# Altium footprint library Package_SO.PcbLib: 333 footprints (part 15 of 21)
Each footprint in its own frame and in the unit in brackets; x right, y up, seen from the top. Pads: shape width x height; smd on the part's side, far side on the other; paste and mask are expansions set on the pad; w line width, h text height; cw(c..) or ccw(c..) is an arc to the next point about the centre after c.
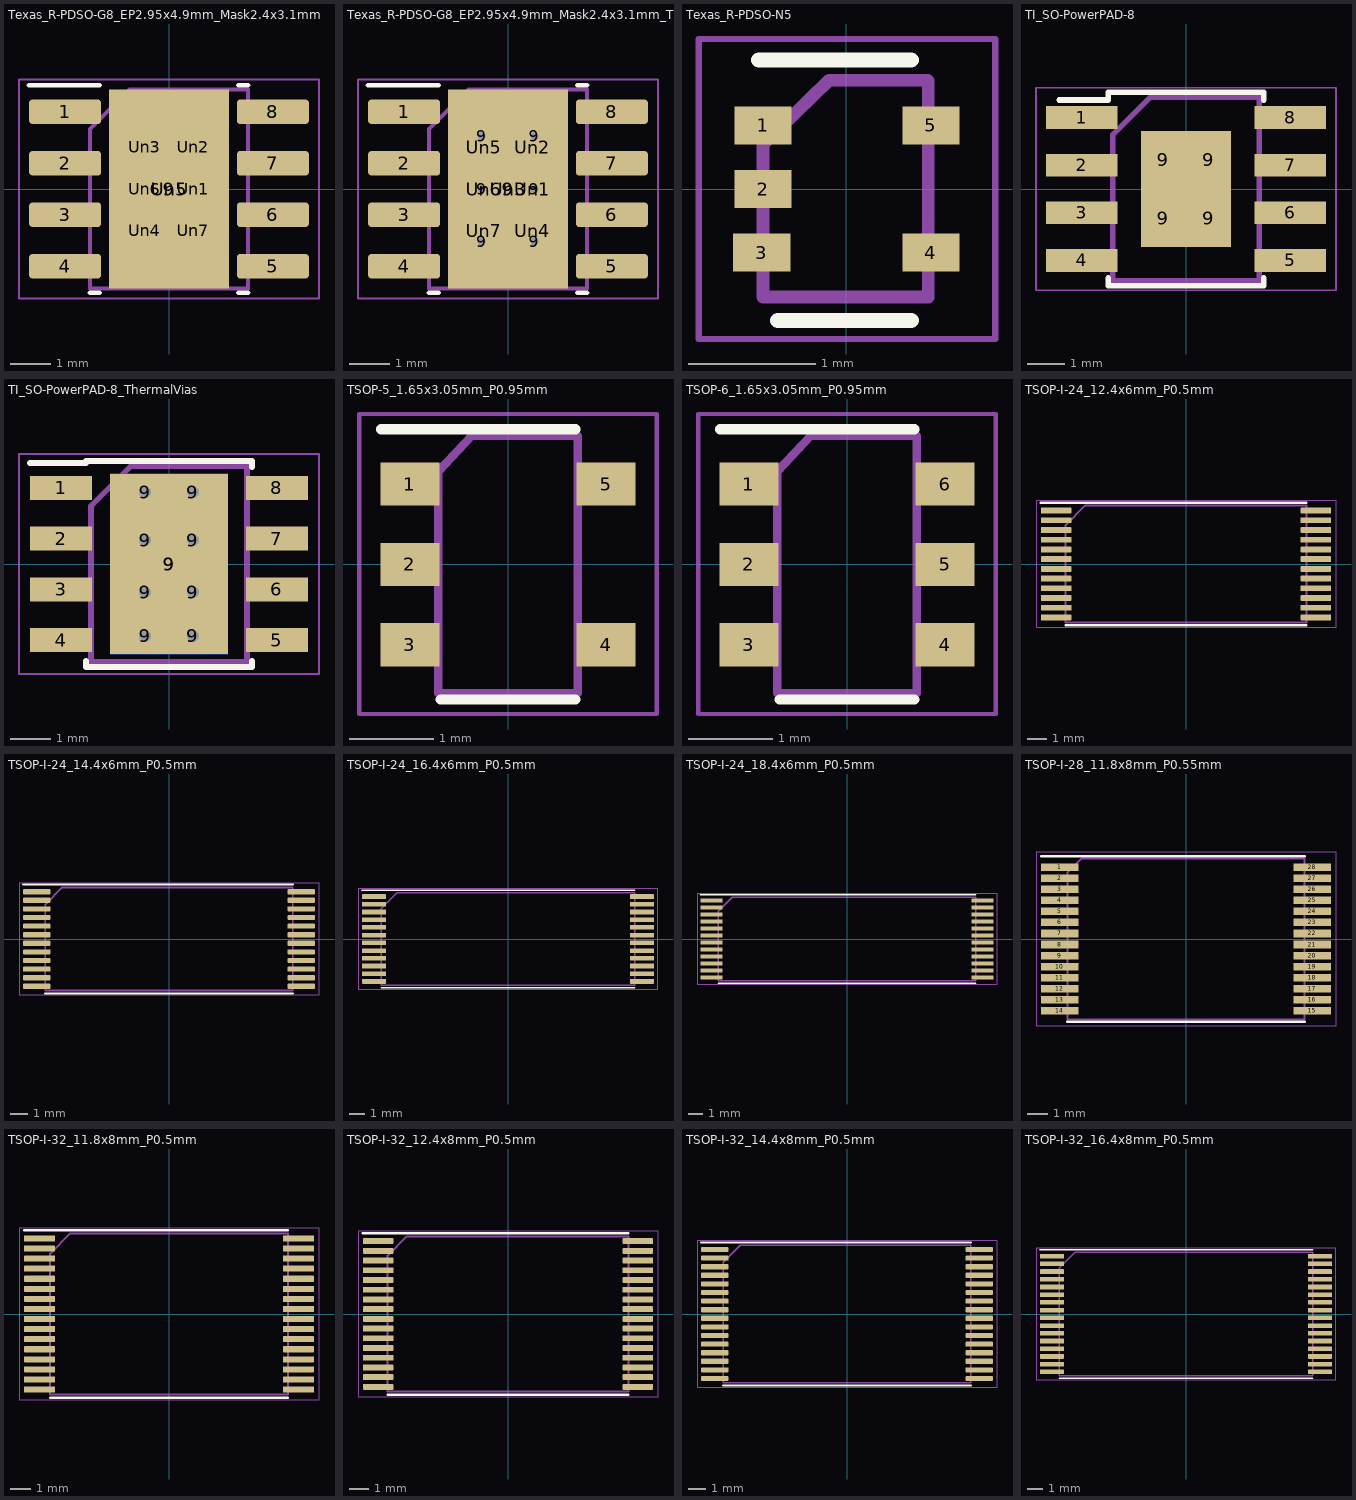
[diagram p14: the footprints below, top view; thin cyan lines are the x and y axes]

## Texas_R-PDSO-G8_EP2.95x4.9mm_Mask2.4x3.1mm [mm]
pads (16):
  rrect25% 1.775x0.6 smd: 1(-2.562,1.905) 2(-2.562,0.635) 3(-2.562,-0.635) 4(-2.562,-1.905) 5(2.562,-1.905) 6(2.562,-0.635) 7(2.562,0.635) 8(2.562,1.905)
  rect 2.95x4.9 smd: 9(0,0)
  rrect25% 0.97x0.83 on Top Paste: Un1(0.6,0) Un2(0.6,1.03) Un3(-0.6,1.03) Un4(-0.6,-1.03) Un6(-0.6,0) Un7(0.6,-1.03)
  rect 2.4x3.1 on Top Solder: Un5(0,0)
F.SilkS:
  lines w0.12: -3.45,2.56 -1.711,2.56 ; -1.95,-2.56 -1.711,-2.56 ; 1.711,-2.56 1.95,-2.56 ; 1.711,2.56 1.95,2.56
F.CrtYd:
  lines w0.05: -3.7,-2.7 3.7,-2.7 3.7,2.7 -3.7,2.7 -3.7,-2.7
F.Fab:
  lines w0.1: -1.95,-2.45 1.95,-2.45 1.95,2.45 -0.975,2.45 -1.95,1.475 -1.95,-2.45
  text "'.Designator'" at -3.969,-0.827 h0.98

## Texas_R-PDSO-G8_EP2.95x4.9mm_Mask2.4x3.1mm_ThermalVias [mm]
pads (23):
  rrect25% 1.775x0.6 smd: 1(-2.562,1.905) 2(-2.562,0.635) 3(-2.562,-0.635) 4(-2.562,-1.905) 5(2.562,-1.905) 6(2.562,-0.635) 7(2.562,0.635) 8(2.562,1.905)
  round 0.5 hole 0.2: 9(-0.65,-1.3) 9(-0.65,0) 9(-0.65,1.3) 9(0.65,-1.3) 9(0.65,0) 9(0.65,1.3)
  rect 1.8x3.1 smd far side: 9(0,0)
  rect 2.95x4.9 smd: 9(0,0)
  rrect25% 1.04x0.89 on Top Paste: Un1(0.6,0) Un2(0.6,1.03) Un4(0.6,-1.03) Un5(-0.6,1.03) Un6(-0.6,0) Un7(-0.6,-1.03)
  rect 2.4x3.1 on Top Solder: Un3(0,0)
F.SilkS:
  lines w0.12: -3.45,2.56 -1.711,2.56 ; -1.95,-2.56 -1.711,-2.56 ; 1.711,-2.56 1.95,-2.56 ; 1.711,2.56 1.95,2.56
F.CrtYd:
  lines w0.05: -3.7,-2.7 -3.7,2.7 3.7,2.7 3.7,-2.7 -3.7,-2.7
F.Fab:
  lines w0.1: -1.95,-2.45 1.95,-2.45 1.95,2.45 -0.975,2.45 -1.95,1.475 -1.95,-2.45
  text "'.Designator'" at -3.969,-0.827 h0.98

## Texas_R-PDSO-N5 [mm]
pads (5):
  rect 0.45x0.3 smd: 1(-0.655,0.5) 2(-0.655,0) 3(-0.665,-0.5) 4(0.665,-0.5) 5(0.665,0.5)
F.SilkS:
  lines w0.12: -0.69,1.015 0.51,1.015 ; -0.54,-1.035 0.51,-1.035
F.CrtYd:
  lines w0.05: -1.16,-1.18 1.17,-1.18 ; -1.16,-1.17 -1.16,1.18 1.17,1.18 1.17,-1.17
F.Fab:
  lines w0.1: -0.135,0.855 -0.655,0.35 -0.655,-0.85 0.645,-0.85 0.645,0.85 ; -0.13,0.855 0.64,0.855
  text "'.Designator'" at 0.252,-1.219 h0.3

## TI_SO-PowerPAD-8 [mm]
pads (12):
  rect 1.91x0.61 smd: 1(-2.78,1.905) 2(-2.78,0.635) 3(-2.78,-0.635) 4(-2.78,-1.905) 5(2.78,-1.905) 6(2.78,-0.635) 7(2.78,0.635) 8(2.78,1.905)
  rect 1.205x1.55 smd: 9(-0.603,-0.775) 9(-0.603,0.775) 9(0.603,-0.775) 9(0.603,0.775)
F.SilkS:
  lines w0.15: -3.375,2.375 -2.075,2.375 -2.075,2.575 2.075,2.575 2.075,2.375 ; -2.075,-2.375 -2.075,-2.575 2.075,-2.575 2.075,-2.375
F.CrtYd:
  lines w0.05: -4,-2.7 4,-2.7 4,2.7 -4,2.7 -4,-2.7
F.Fab:
  lines w0.15: -1.95,-2.45 -1.95,1.45 -0.95,2.45 1.95,2.45 1.95,-2.45 -1.95,-2.45
  text "'.Designator'" at -4.047,-0.84 h1

## TI_SO-PowerPAD-8_ThermalVias [mm]
pads (19):
  rect 1.55x0.6 smd: 1(-2.7,1.905) 2(-2.7,0.635) 3(-2.7,-0.635) 4(-2.7,-1.905) 5(2.7,-1.905) 6(2.7,-0.635) 7(2.7,0.635) 8(2.7,1.905)
  round 0.6 hole 0.3: 9(-0.6,-1.8) 9(-0.6,-0.7) 9(-0.6,0.6) 9(-0.6,1.8) 9(0.6,-1.8) 9(0.6,-0.7) 9(0.6,0.6) 9(0.6,1.8)
  rect 2.95x4.5 smd: 9(0,0)
  rect 2.95x4.5 smd far side: 9(0,0)
  rect 2.6x3.1 smd: 9(0,0)
F.SilkS:
  lines w0.15: -3.475,2.525 -2.075,2.525 -2.075,2.575 2.075,2.575 2.075,2.43 ; -2.075,-2.43 -2.075,-2.575 2.075,-2.575 2.075,-2.43
F.CrtYd:
  lines w0.05: -3.75,-2.75 -3.75,2.75 3.75,2.75 3.75,-2.75 -3.75,-2.75
F.Fab:
  lines w0.15: -1.95,-2.45 1.95,-2.45 1.95,2.45 -0.95,2.45 -1.95,1.45 -1.95,-2.45
  text "'.Designator'" at -3.642,-0.756 h0.9

## TSOP-5_1.65x3.05mm_P0.95mm [mm]
pads (5):
  rect 0.7x0.51 smd: 1(-1.16,0.95) 2(-1.16,0) 3(-1.16,-0.95) 4(1.16,-0.95) 5(1.16,0.95)
F.SilkS:
  lines w0.12: -1.5,1.6 0.8,1.6 ; -0.8,-1.6 0.8,-1.6
F.CrtYd:
  lines w0.05: -1.76,-1.77 1.76,-1.77 1.76,1.78 -1.76,1.78 -1.76,-1.77
F.Fab:
  lines w0.1: -0.825,-1.525 -0.825,1.1 -0.425,1.525 0.825,1.525 0.825,-1.525 -0.825,-1.525
  text "'.Designator'" at 0.42,-2.023 h0.5

## TSOP-6_1.65x3.05mm_P0.95mm [mm]
pads (6):
  rect 0.7x0.51 smd: 1(-1.16,0.95) 2(-1.16,0) 3(-1.16,-0.95) 4(1.16,-0.95) 5(1.16,0) 6(1.16,0.95)
F.SilkS:
  lines w0.12: -1.5,1.6 0.8,1.6 ; -0.8,-1.6 0.8,-1.6
F.CrtYd:
  lines w0.05: -1.76,-1.77 1.76,-1.77 1.76,1.78 -1.76,1.78 -1.76,-1.77
F.Fab:
  lines w0.1: -0.825,-1.525 -0.825,1.1 -0.425,1.525 0.825,1.525 0.825,-1.525 -0.825,-1.525
  text "'.Designator'" at 0.42,-2.023 h0.5

## TSOP-I-24_12.4x6mm_P0.5mm [mm]
pads (24):
  rrect25% 1.575x0.3 smd: 1(-6.687,2.75) 2(-6.687,2.25) 3(-6.687,1.75) 4(-6.687,1.25) 5(-6.687,0.75) 6(-6.687,0.25) 7(-6.687,-0.25) 8(-6.687,-0.75) 9(-6.687,-1.25) 10(-6.687,-1.75) 11(-6.687,-2.25) 12(-6.687,-2.75) 13(6.687,-2.75) 14(6.687,-2.25) 15(6.687,-1.75) 16(6.687,-1.25) 17(6.687,-0.75) 18(6.687,-0.25) 19(6.687,0.25) 20(6.687,0.75) 21(6.687,1.25) 22(6.687,1.75) 23(6.687,2.25) 24(6.687,2.75)
F.SilkS:
  lines w0.12: -7.475,3.16 0,3.16 6.2,3.16 ; -6.2,-3.16 0,-3.16 6.2,-3.16
F.CrtYd:
  lines w0.05: -7.72,-3.25 -7.72,3.25 7.72,3.25 7.72,-3.25 -7.72,-3.25
F.Fab:
  lines w0.1: -6.2,-3 6.2,-3 6.2,3 -5.2,3 -6.2,2 -6.2,-3
  text "'.Designator'" at -4.047,-0.84 h1

## TSOP-I-24_14.4x6mm_P0.5mm [mm]
pads (24):
  rrect25% 1.575x0.3 smd: 1(-7.688,2.75) 2(-7.688,2.25) 3(-7.688,1.75) 4(-7.688,1.25) 5(-7.688,0.75) 6(-7.688,0.25) 7(-7.688,-0.25) 8(-7.688,-0.75) 9(-7.688,-1.25) 10(-7.688,-1.75) 11(-7.688,-2.25) 12(-7.688,-2.75) 13(7.688,-2.75) 14(7.688,-2.25) 15(7.688,-1.75) 16(7.688,-1.25) 17(7.688,-0.75) 18(7.688,-0.25) 19(7.688,0.25) 20(7.688,0.75) 21(7.688,1.25) 22(7.688,1.75) 23(7.688,2.25) 24(7.688,2.75)
F.SilkS:
  lines w0.12: -8.475,3.16 0,3.16 7.2,3.16 ; -7.2,-3.16 0,-3.16 7.2,-3.16
F.CrtYd:
  lines w0.05: -8.72,-3.25 -8.72,3.25 8.72,3.25 8.72,-3.25 -8.72,-3.25
F.Fab:
  lines w0.1: -7.2,-3 7.2,-3 7.2,3 -6.2,3 -7.2,2 -7.2,-3
  text "'.Designator'" at -4.047,-0.84 h1

## TSOP-I-24_16.4x6mm_P0.5mm [mm]
pads (24):
  rrect25% 1.575x0.3 smd: 1(-8.688,2.75) 2(-8.688,2.25) 3(-8.688,1.75) 4(-8.688,1.25) 5(-8.688,0.75) 6(-8.688,0.25) 7(-8.688,-0.25) 8(-8.688,-0.75) 9(-8.688,-1.25) 10(-8.688,-1.75) 11(-8.688,-2.25) 12(-8.688,-2.75) 13(8.688,-2.75) 14(8.688,-2.25) 15(8.688,-1.75) 16(8.688,-1.25) 17(8.688,-0.75) 18(8.688,-0.25) 19(8.688,0.25) 20(8.688,0.75) 21(8.688,1.25) 22(8.688,1.75) 23(8.688,2.25) 24(8.688,2.75)
F.SilkS:
  lines w0.12: -9.475,3.16 0,3.16 8.2,3.16 ; -8.2,-3.16 0,-3.16 8.2,-3.16
F.CrtYd:
  lines w0.05: -9.72,-3.25 -9.72,3.25 9.72,3.25 9.72,-3.25 -9.72,-3.25
F.Fab:
  lines w0.1: -8.2,-3 8.2,-3 8.2,3 -7.2,3 -8.2,2 -8.2,-3
  text "'.Designator'" at -4.047,-0.84 h1

## TSOP-I-24_18.4x6mm_P0.5mm [mm]
pads (24):
  rrect25% 1.575x0.3 smd: 1(-9.687,2.75) 2(-9.687,2.25) 3(-9.687,1.75) 4(-9.687,1.25) 5(-9.687,0.75) 6(-9.687,0.25) 7(-9.687,-0.25) 8(-9.687,-0.75) 9(-9.687,-1.25) 10(-9.687,-1.75) 11(-9.687,-2.25) 12(-9.687,-2.75) 13(9.687,-2.75) 14(9.687,-2.25) 15(9.687,-1.75) 16(9.687,-1.25) 17(9.687,-0.75) 18(9.687,-0.25) 19(9.687,0.25) 20(9.687,0.75) 21(9.687,1.25) 22(9.687,1.75) 23(9.687,2.25) 24(9.687,2.75)
F.SilkS:
  lines w0.12: -10.475,3.16 0,3.16 9.2,3.16 ; -9.2,-3.16 0,-3.16 9.2,-3.16
F.CrtYd:
  lines w0.05: -10.73,-3.25 -10.73,3.25 10.73,3.25 10.73,-3.25 -10.73,-3.25
F.Fab:
  lines w0.1: -9.2,-3 9.2,-3 9.2,3 -8.2,3 -9.2,2 -9.2,-3
  text "'.Designator'" at -4.047,-0.84 h1

## TSOP-I-28_11.8x8mm_P0.55mm [mm]
pads (28):
  rect 1.87x0.38 smd: 1(-6.27,3.575) 2(-6.27,3.025) 3(-6.27,2.475) 4(-6.27,1.925) 5(-6.27,1.375) 6(-6.27,0.825) 7(-6.27,0.275) 8(-6.27,-0.275) 9(-6.27,-0.825) 10(-6.27,-1.375) 11(-6.27,-1.925) 12(-6.27,-2.475) 13(-6.27,-3.025) 14(-6.27,-3.575) 15(6.27,-3.575) 16(6.27,-3.025) 17(6.27,-2.475) 18(6.27,-1.925) 19(6.27,-1.375) 20(6.27,-0.825) 21(6.27,-0.275) 22(6.27,0.275) 23(6.27,0.825) 24(6.27,1.375) 25(6.27,1.925) 26(6.27,2.475) 27(6.27,3.025) 28(6.27,3.575)
F.SilkS:
  lines w0.12: -7.205,4.11 5.9,4.11 ; -5.9,-4.11 5.9,-4.11
F.CrtYd:
  lines w0.05: -7.46,-4.35 7.46,-4.35 7.46,4.35 -7.46,4.35 -7.46,-4.35
F.Fab:
  lines w0.1: -5.9,-4 -5.9,3.3 -5.2,4 5.9,4 5.9,-4 -5.9,-4
  text "'.Designator'" at -3.547,-0.84 h1

## TSOP-I-32_11.8x8mm_P0.5mm [mm]
pads (32):
  rrect25% 1.55x0.3 smd: 1(-6.425,3.75) 2(-6.425,3.25) 3(-6.425,2.75) 4(-6.425,2.25) 5(-6.425,1.75) 6(-6.425,1.25) 7(-6.425,0.75) 8(-6.425,0.25) 9(-6.425,-0.25) 10(-6.425,-0.75) 11(-6.425,-1.25) 12(-6.425,-1.75) 13(-6.425,-2.25) 14(-6.425,-2.75) 15(-6.425,-3.25) 16(-6.425,-3.75) 17(6.425,-3.75) 18(6.425,-3.25) 19(6.425,-2.75) 20(6.425,-2.25) 21(6.425,-1.75) 22(6.425,-1.25) 23(6.425,-0.75) 24(6.425,-0.25) 25(6.425,0.25) 26(6.425,0.75) 27(6.425,1.25) 28(6.425,1.75) 29(6.425,2.25) 30(6.425,2.75) 31(6.425,3.25) 32(6.425,3.75)
F.SilkS:
  lines w0.12: -7.2,4.16 0,4.16 5.9,4.16 ; -5.9,-4.16 0,-4.16 5.9,-4.16
F.CrtYd:
  lines w0.05: -7.45,-4.25 -7.45,4.25 7.45,4.25 7.45,-4.25 -7.45,-4.25
F.Fab:
  lines w0.1: -5.9,-4 -5.9,3 -4.9,4 5.9,4 5.9,-4 -5.9,-4
  text "'.Designator'" at -4.047,-0.84 h1

## TSOP-I-32_12.4x8mm_P0.5mm [mm]
pads (32):
  rrect25% 1.575x0.3 smd: 1(-6.687,3.75) 2(-6.687,3.25) 3(-6.687,2.75) 4(-6.687,2.25) 5(-6.687,1.75) 6(-6.687,1.25) 7(-6.687,0.75) 8(-6.687,0.25) 9(-6.687,-0.25) 10(-6.687,-0.75) 11(-6.687,-1.25) 12(-6.687,-1.75) 13(-6.687,-2.25) 14(-6.687,-2.75) 15(-6.687,-3.25) 16(-6.687,-3.75) 17(6.687,-3.75) 18(6.687,-3.25) 19(6.687,-2.75) 20(6.687,-2.25) 21(6.687,-1.75) 22(6.687,-1.25) 23(6.687,-0.75) 24(6.687,-0.25) 25(6.687,0.25) 26(6.687,0.75) 27(6.687,1.25) 28(6.687,1.75) 29(6.687,2.25) 30(6.687,2.75) 31(6.687,3.25) 32(6.687,3.75)
F.SilkS:
  lines w0.12: -7.475,4.16 0,4.16 6.2,4.16 ; -6.2,-4.16 0,-4.16 6.2,-4.16
F.CrtYd:
  lines w0.05: -7.72,-4.25 -7.72,4.25 7.72,4.25 7.72,-4.25 -7.72,-4.25
F.Fab:
  lines w0.1: -6.2,-4 6.2,-4 6.2,4 -5.2,4 -6.2,3 -6.2,-4
  text "'.Designator'" at -4.047,-0.84 h1

## TSOP-I-32_14.4x8mm_P0.5mm [mm]
pads (32):
  rrect25% 1.575x0.3 smd: 1(-7.688,3.75) 2(-7.688,3.25) 3(-7.688,2.75) 4(-7.688,2.25) 5(-7.688,1.75) 6(-7.688,1.25) 7(-7.688,0.75) 8(-7.688,0.25) 9(-7.688,-0.25) 10(-7.688,-0.75) 11(-7.688,-1.25) 12(-7.688,-1.75) 13(-7.688,-2.25) 14(-7.688,-2.75) 15(-7.688,-3.25) 16(-7.688,-3.75) 17(7.688,-3.75) 18(7.688,-3.25) 19(7.688,-2.75) 20(7.688,-2.25) 21(7.688,-1.75) 22(7.688,-1.25) 23(7.688,-0.75) 24(7.688,-0.25) 25(7.688,0.25) 26(7.688,0.75) 27(7.688,1.25) 28(7.688,1.75) 29(7.688,2.25) 30(7.688,2.75) 31(7.688,3.25) 32(7.688,3.75)
F.SilkS:
  lines w0.12: -8.475,4.16 0,4.16 7.2,4.16 ; -7.2,-4.16 0,-4.16 7.2,-4.16
F.CrtYd:
  lines w0.05: -8.72,-4.25 -8.72,4.25 8.72,4.25 8.72,-4.25 -8.72,-4.25
F.Fab:
  lines w0.1: -7.2,-4 7.2,-4 7.2,4 -6.2,4 -7.2,3 -7.2,-4
  text "'.Designator'" at -4.047,-0.84 h1

## TSOP-I-32_16.4x8mm_P0.5mm [mm]
pads (32):
  rrect25% 1.575x0.3 smd: 1(-8.688,3.75) 2(-8.688,3.25) 3(-8.688,2.75) 4(-8.688,2.25) 5(-8.688,1.75) 6(-8.688,1.25) 7(-8.688,0.75) 8(-8.688,0.25) 9(-8.688,-0.25) 10(-8.688,-0.75) 11(-8.688,-1.25) 12(-8.688,-1.75) 13(-8.688,-2.25) 14(-8.688,-2.75) 15(-8.688,-3.25) 16(-8.688,-3.75) 17(8.688,-3.75) 18(8.688,-3.25) 19(8.688,-2.75) 20(8.688,-2.25) 21(8.688,-1.75) 22(8.688,-1.25) 23(8.688,-0.75) 24(8.688,-0.25) 25(8.688,0.25) 26(8.688,0.75) 27(8.688,1.25) 28(8.688,1.75) 29(8.688,2.25) 30(8.688,2.75) 31(8.688,3.25) 32(8.688,3.75)
F.SilkS:
  lines w0.12: -9.475,4.16 0,4.16 8.2,4.16 ; -8.2,-4.16 0,-4.16 8.2,-4.16
F.CrtYd:
  lines w0.05: -9.72,-4.25 -9.72,4.25 9.72,4.25 9.72,-4.25 -9.72,-4.25
F.Fab:
  lines w0.1: -8.2,-4 8.2,-4 8.2,4 -7.2,4 -8.2,3 -8.2,-4
  text "'.Designator'" at -4.047,-0.84 h1